# Altium footprint library 3.16-变压器.PcbLib: 17 footprints (part 1 of 2)
Each footprint in its own frame and in the unit in brackets; x right, y up, seen from the top. Pads: shape width x height; smd on the part's side, far side on the other; paste and mask are expansions set on the pad; w line width, h text height; cw(c..) or ccw(c..) is an arc to the next point about the centre after c.
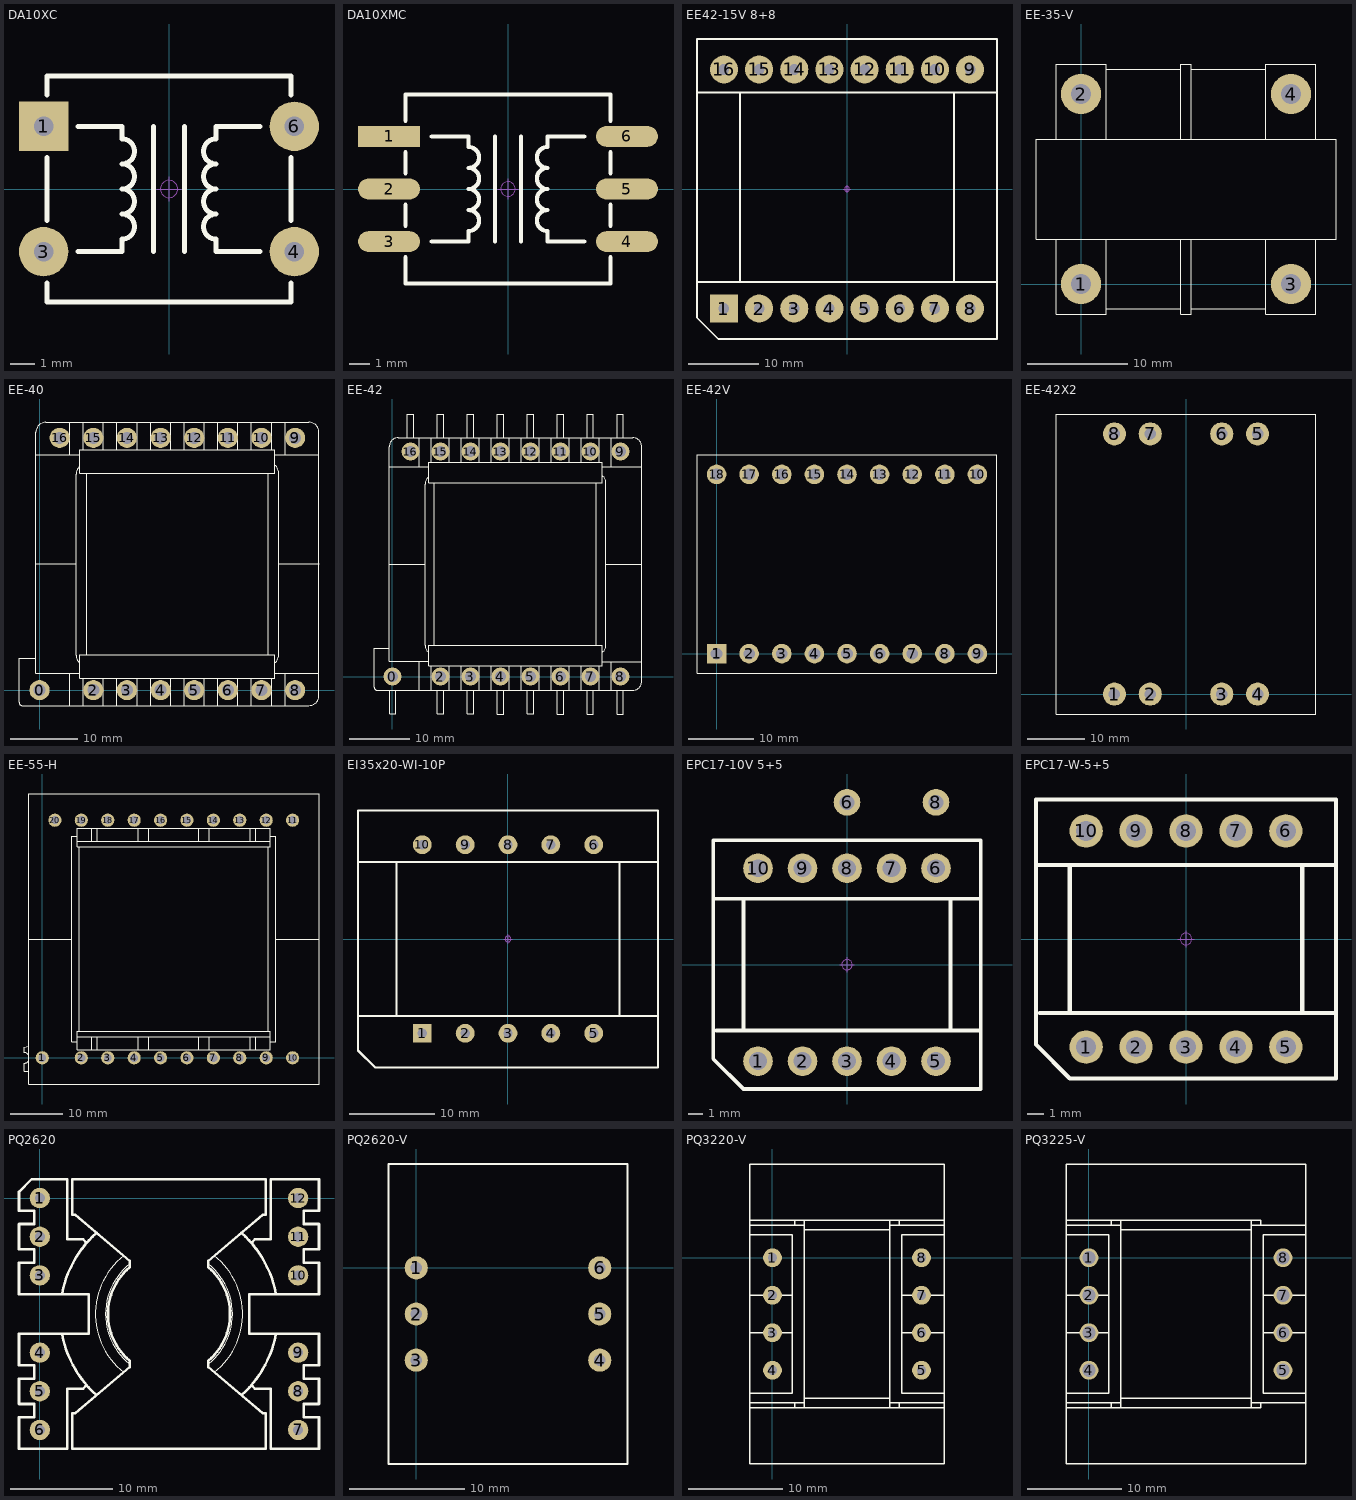
[diagram p0: the footprints below, top view; thin cyan lines are the x and y axes]

## DA10XC [mm] "9mm*9.52mm*6.35mm(长*宽*高)  淘宝ID:黄晶宝石"
pads (4):
  rect 2x2 hole 0.8 unplated: 1(-5.08,2.54)
  round 2 hole 0.8 unplated: 3(-5.08,-2.54) 4(5.08,-2.54) 6(5.08,2.54)
Top Overlay:
  lines w0.203: -4.953,-3.81 -4.953,-4.572 4.953,-4.572 4.953,-3.81 ; -4.953,-1.27 -4.953,1.27 ; -4.953,3.81 -4.953,4.572 4.953,4.572 4.953,3.81 ; -3.683,-2.54 -1.905,-2.54 -1.905,-2.032 ccw(c-1.905,-1.524) -1.905,-1.016 ccw(c-1.905,-0.508) -1.905,0 ccw(c-1.905,0.508) -1.905,1.016 ccw(c-1.905,1.524) -1.905,2.032 -1.905,2.54 -3.683,2.54 ; -0.635,-2.54 -0.635,2.54 ; 0.635,-2.54 0.635,2.54 ; 3.683,-2.54 1.905,-2.54 1.905,-2.032 cw(c1.905,-1.524) 1.905,-1.016 cw(c1.905,-0.508) 1.905,0 cw(c1.905,0.508) 1.905,1.016 cw(c1.905,1.524) 1.905,2.032 1.905,2.54 3.683,2.54 ; 4.953,-1.27 4.953,1.27
Mechanical 15:
  circle w0.05: c0,0 r0.35
  lines w0.05: -0.5,0 0.5,0 ; 0,-0.5 0,0.5
3D body "DA10XC.STEP": height 2.95, standoff -6.9, extent -5.205,-4.5 5.205,4.5

## DA10XMC [mm] "9mm*9.52mm*6.35mm(长*宽*高)  淘宝ID:黄晶宝石"
pads (6):
  rect 3x1 smd: 1(-5.75,2.54)
  oval 3x1 smd: 2(-5.75,0) 3(-5.75,-2.54) 4(5.75,-2.54) 5(5.75,0) 6(5.75,2.54)
Top Overlay:
  lines w0.203: -4.953,-3.302 -4.953,-4.572 4.953,-4.572 4.953,-3.302 ; -4.953,-1.778 -4.953,-0.762 ; -4.953,0.762 -4.953,1.778 ; -4.953,3.302 -4.953,4.572 4.953,4.572 4.953,3.302 ; -3.683,-2.54 -1.905,-2.54 -1.905,-2.032 ccw(c-1.905,-1.524) -1.905,-1.016 ccw(c-1.905,-0.508) -1.905,0 ccw(c-1.905,0.508) -1.905,1.016 ccw(c-1.905,1.524) -1.905,2.032 -1.905,2.54 -3.683,2.54 ; -0.635,-2.54 -0.635,2.54 ; 0.635,-2.54 0.635,2.54 ; 3.683,-2.54 1.905,-2.54 1.905,-2.032 cw(c1.905,-1.524) 1.905,-1.016 cw(c1.905,-0.508) 1.905,0 cw(c1.905,0.508) 1.905,1.016 cw(c1.905,1.524) 1.905,2.032 1.905,2.54 3.683,2.54 ; 4.953,-1.778 4.953,-0.762 ; 4.953,0.762 4.953,1.778
Mechanical 15:
  circle w0.05: c0,0 r0.35
  lines w0.05: -0.5,0 0.5,0 ; 0,-0.5 0,0.5
3D body "DA10xmc.STEP": height 6.4, standoff -0.08, extent -6.35,-4.5 6.35,4.5

## EE42-15V 8+8 [mm] "磁芯 42mm  宽42mm  高32mm"
pads (16):
  rect 4x4 hole 1.5: 1(-17.5,-17)
  round 4 hole 1.5: 2(-12.5,-17) 3(-7.5,-17) 4(-2.5,-17) 5(2.5,-17) 6(7.5,-17) 7(12.5,-17) 8(17.5,-17) 9(17.5,17) 10(12.5,17) 11(7.5,17) 12(2.5,17) 13(-2.5,17) 14(-7.5,17) 15(-12.5,17) 16(-17.5,17)
Top Overlay:
  lines w0.254: -21.336,-13.208 21.336,-13.208 ; -21.336,13.716 21.336,13.716 ; -15.24,-13.208 -15.24,13.716 ; 15.24,-13.208 15.24,13.716 ; -21.336,-18.288 -21.336,21.336 21.336,21.336 21.336,-21.336 -18.288,-21.336 -21.336,-18.288
Mechanical 15:
  circle w0.05: c0,0 r0.35
  lines w0.05: -0.5,0 0.5,0 ; 0,-0.5 0,0.5
3D body "EE42-15_8_8_asm.STEP": height 31.55, standoff -3.15, extent -21.1,-21.1 21.1,21.1

## EE-35-V [mm] "淘宝ID:黄晶宝石   店铺网址:https://shop463601444.taobao.com"
pads (4):
  round 4 hole 2: 1(0,0) 2(0,19) 3(21,0) 4(21,19)
Top Overlay:
  lines w0.1: 2.5,-2.453 10,-2.453 ; 2.5,4.5 2.5,-3 -2.5,-3 -2.5,4.5 ; 2.5,14.5 2.5,22 -2.5,22 ; 2.5,21.453 10,21.453 ; 10,4.5 10,-3 11,-3 11,4.5 ; 10,14.5 10,22 11,22 11,14.5 ; 11,-2.453 18.5,-2.453 ; 11,21.453 18.5,21.453 ; 18.5,4.5 18.5,-3 23.5,-3 23.5,4.5 ; 18.5,14.5 18.5,22 23.5,22 23.5,14.5 ; -2.5,4.5 -4.5,4.5 -4.5,14.5 25.5,14.5 25.5,4.5 23.5,4.5 ; -2.5,4.5 23.5,4.5 ; -2.5,22 -2.5,14.5 -2.5,22 ; 0,19.25 0,19.25
3D body "EE35-4.STEP": height 35.61, standoff -5.5, extent -4.57,-2.921 24.89,21.579

## EE-40 [mm] "淘宝ID:黄晶宝石   店铺网址:https://shop463601444.taobao.com"
pads (16):
  round 3 hole 1.8: 0(0,0) 2(8,0) 3(13,0) 4(18,0) 5(23,0) 6(28,0) 7(33,0) 8(38,0) 9(38,37.5) 10(33,37.5) 11(28,37.5) 12(23,37.5) 13(18,37.5) 14(13,37.5) 15(8,37.5) 16(3,37.5)
Top Overlay:
  lines w0.1: -2.55,-2.303 40.05,-2.303 ; -2.55,-2.3 cw(c-2.55,-1.8) -3.05,-1.8 -3.05,4.7 -0.556,4.7 ; -0.55,2.509 -0.55,38.3 cw(c0.95,38.3) 0.95,39.8 40.05,39.8 cw(c40.05,38.3) 41.55,38.3 41.55,-0.8 cw(c40.05,-0.8) 40.05,-2.3 ; -0.55,18.75 5.449,18.75 ; -0.544,2.509 6,2.509 ; -0.544,34.991 6,34.991 ; 4.5,-2.303 4.5,2.509 ; 4.5,34.991 4.5,39.8 ; 5.995,4.043 cw(c6.949,5.2) 5.449,5.2 5.449,32.079 cw(c6.949,32.079) 5.995,33.236 ; 6.5,-2.303 6.5,1.75 ; 6.5,35.75 6.5,39.8 ; 7,5.25 7,32.25 ; 9.5,-2.303 9.5,1.75 ; 9.5,35.75 9.5,39.8 ; 11.5,-2.303 11.5,1.75 ; 11.5,35.75 11.5,39.8 ; 14.5,-2.303 14.5,1.75 ; 14.5,35.75 14.5,39.8 ; 16.5,-2.303 16.5,1.75 ; 16.5,35.75 16.5,39.8 ; 19.5,-2.303 19.5,1.75 ; 19.5,35.75 19.5,39.8 ; 21.5,-2.303 21.5,1.75 ; 21.5,35.75 21.5,39.8 ; 24.5,-2.303 24.5,1.75 ; 24.5,35.75 24.5,39.8 ; 26.5,-2.303 26.5,1.75 ; 26.5,35.75 26.5,39.8 ; 29.5,-2.303 29.5,1.75 ; 29.5,35.75 29.5,39.8 ; 31.5,-2.303 31.5,1.75 ; 31.5,35.75 31.5,39.8 ; 34,5.25 34,32.25 ; 34.5,-2.303 34.5,1.75 ; 34.5,35.75 34.5,39.8 ; 35,2.5 41.55,2.5 ; 35,35 41.55,35 ; 35.005,4.042 ccw(c34.051,5.199) 35.551,5.199 35.551,32.3 ccw(c34.051,32.3) 35.005,33.457 ; 35.551,18.75 41.55,18.75 ; 36.5,-2.303 36.5,2.5 ; 36.5,35 36.5,39.8 ; 6,1.75 35,1.75 ; 6,1.75 35,1.75 ; 6,1.75 6,5.25 35,5.25 35,1.75 ; 6,32.25 35,32.25 35,35.75 6,35.75 6,32.25
3D body "User Library-power_transformer.step": height 32.94, standoff -3.5, extent 0.254,-3.478 40.259,40.562

## EE-42 [mm] "淘宝ID:黄晶宝石   店铺网址:https://shop463601444.taobao.com"
pads (16):
  round 3 hole 1.8: 0(0,0) 2(8,0) 3(13,0) 4(18,0) 5(23,0) 6(28,0) 7(33,0) 8(38,0) 9(38,37.5) 10(33,37.5) 11(28,37.5) 12(23,37.5) 13(18,37.5) 14(13,37.5) 15(8,37.5) 16(3,37.5)
Top Overlay:
  lines w0.1: -2.55,-2.303 40.05,-2.303 ; -2.55,-2.3 cw(c-2.55,-1.8) -3.05,-1.8 -3.05,4.7 -0.556,4.7 ; -0.55,2.509 -0.55,38.3 cw(c0.95,38.3) 0.95,39.8 40.05,39.8 cw(c40.05,38.3) 41.55,38.3 41.55,-0.8 cw(c40.05,-0.8) 40.05,-2.3 ; -0.55,18.75 5.449,18.75 ; -0.544,2.509 6,2.509 ; -0.544,34.991 6,34.991 ; -0.5,-2.303 -0.5,-6.248 0.5,-6.248 0.5,-2.303 ; 2.5,39.809 2.5,43.75 3.5,43.75 3.5,39.814 ; 4.5,-2.303 4.5,2.509 ; 4.5,34.991 4.5,39.8 ; 5.995,4.043 cw(c6.949,5.2) 5.449,5.2 5.449,32.079 cw(c6.949,32.079) 5.995,33.236 ; 6.5,-2.303 6.5,1.75 ; 6.5,35.75 6.5,39.8 ; 7,5.25 7,32.25 ; 7.5,-2.3 7.5,-6.248 8.493,-6.248 8.5,-6.241 8.5,-2.3 ; 7.5,39.8 7.5,43.748 8.493,43.748 8.5,43.741 8.5,39.8 ; 9.5,-2.303 9.5,1.75 ; 9.5,35.75 9.5,39.8 ; 11.5,-2.303 11.5,1.75 ; 11.5,35.75 11.5,39.8 ; 12.5,-2.3 12.5,-6.247 13.5,-6.247 13.5,-2.3 ; 12.5,39.8 12.5,43.747 13.5,43.747 13.5,39.8 ; 14.5,-2.303 14.5,1.75 ; 14.5,35.75 14.5,39.8 ; 16.5,-2.303 16.5,1.75 ; 16.5,35.75 16.5,39.8 ; 17.5,-2.3 17.5,-6.25 18.5,-6.25 18.5,-2.311 ; 17.5,39.8 17.5,43.75 18.5,43.75 18.5,39.811 ; 19.5,-2.303 19.5,1.75 ; 19.5,35.75 19.5,39.8 ; 21.5,-2.303 21.5,1.75 ; 21.5,35.75 21.5,39.8 ; 22.5,-2.3 22.5,-6.238 23.495,-6.238 23.5,-6.233 23.5,-2.3 ; 22.5,39.8 22.5,43.738 23.495,43.738 23.5,43.733 23.5,39.8 ; 24.5,-2.303 24.5,1.75 ; 24.5,35.75 24.5,39.8 ; 26.5,-2.303 26.5,1.75 ; 26.5,35.75 26.5,39.8 ; 27.5,-2.311 27.5,-6.25 28.5,-6.25 28.5,-2.313 ; 27.5,39.811 27.5,43.75 28.5,43.75 28.5,39.813 ; 29.5,-2.303 29.5,1.75 ; 29.5,35.75 29.5,39.8 ; 31.5,-2.303 31.5,1.75 ; 31.5,35.75 31.5,39.8 ; 32.5,-2.309 32.5,-6.25 33.488,-6.25 33.488,-2.313 ; 32.5,39.809 32.5,43.75 33.488,43.75 33.488,39.813 ; 34,5.25 34,32.25 ; 34.5,-2.303 34.5,1.75 ; 34.5,35.75 34.5,39.8 ; 35,2.5 41.55,2.5 ; 35,35 41.55,35 ; 35.005,4.042 ccw(c34.051,5.199) 35.551,5.199 35.551,32.3 ccw(c34.051,32.3) 35.005,33.457 ; 35.551,18.75 41.55,18.75 ; 36.5,-2.303 36.5,2.5 ; 36.5,35 36.5,39.8 ; 37.5,-2.324 37.5,-6.25 38.5,-6.25 38.5,-2.317 ; 37.5,39.824 37.5,43.75 38.5,43.75 38.5,39.817 ; 6,1.75 35,1.75 ; 6,1.75 35,1.75 ; 6,1.75 6,5.25 35,5.25 35,1.75 ; 6,32.25 35,32.25 35,35.75 6,35.75 6,32.25
3D body "Coilcraft-GA3366-BL.step": height 29.2, standoff -5, extent -0.229,-3 40.271,40.5

## EE-42V [mm] "淘宝ID:黄晶宝石   店铺网址:https://shop463601444.taobao.com"
pads (18):
  rect 3x3 hole 1.8: 1(0,0)
  round 3 hole 1.8: 2(5,0) 3(10,0) 4(15,0) 5(20,0) 6(25,0) 7(30,0) 8(35,0) 9(40,0) 10(40,27.5) 11(35,27.5) 12(30,27.5) 13(25,27.5) 14(20,27.5) 15(15,27.5) 16(10,27.5) 17(5,27.5) 18(0,27.5)
Top Overlay:
  lines w0.1: -3,-3 -3,30.5 43,30.5 43,-3 -3,-3
3D body "EE42.STEP": height 48.8, standoff -4.15, extent -2.667,-2.855 42.833,29.845

## EE-42X2 [mm] "淘宝ID:黄晶宝石   店铺网址:https://shop463601444.taobao.com"
pads (8):
  round 4 hole 2: 1(-12.4,0) 2(-6.2,0) 3(6.2,0) 4(12.4,0) 5(12.4,45.1) 6(6.2,45.1) 7(-6.2,45.1) 8(-12.4,45.1)
Top Overlay:
  lines w0.1: -22.5,-3.45 22.5,-3.45 22.5,48.55 -22.5,48.55 -22.5,-3.45
3D body "EE42x2.STEP": height 44.16, standoff -3.2, extent -21.227,-1.905 20.973,47.095

## EE-55-H [mm]
pads (20):
  round 2.5 hole 1.5: 1(0,0) 2(7.4,0) 3(12.4,0) 4(17.4,0) 5(22.4,0) 6(27.4,0) 7(32.4,0) 8(37.4,0) 9(42.4,0) 10(47.4,0) 11(47.4,45) 12(42.4,45) 13(37.4,45) 14(32.4,45) 15(27.4,45) 16(22.4,45) 17(17.4,45) 18(12.4,45) 19(7.4,45) 20(2.4,45)
Top Overlay:
  lines w0.1: -3.4,-1 ccw(c-3.4,0) -2.605,-0.607 ; -3.4,1 cw(c-3.4,0) -2.605,0.607
  lines w0.2: -3.4,-1 -3.4,-2.5 -2.613,-2.5 ; -3.4,1 -3.4,2 -2.603,2.214 ; -2.566,22.5 5.585,22.5 ; 6.589,3 5.6,3 5.6,42 6.589,42 ; 6.6,1.5 43.2,1.5 ; 6.6,40.002 6.6,43.5 43.2,43.5 ; 6.602,1.502 6.602,5 43.198,5 43.198,1.502 ; 6.602,4 43.198,4 ; 6.602,40 43.198,40 43.198,43.498 ; 6.602,41 43.198,41 ; 7,5 7,40 ; 9.4,1.507 9.4,4.002 ; 9.4,40.998 9.4,43.493 ; 10.4,1.507 10.4,4.002 ; 10.4,40.998 10.4,43.493 ; 18.15,1.514 18.15,3.993 ; 18.15,41.007 18.15,43.486 ; 20.15,1.514 20.15,3.993 ; 20.15,41.007 20.15,43.486 ; 29.65,1.514 29.65,3.993 ; 29.65,41.007 29.65,43.486 ; 31.65,1.514 31.65,3.993 ; 31.65,41.007 31.65,43.486 ; 39.4,1.507 39.4,3.993 ; 39.4,41.007 39.4,43.493 ; 40.4,1.507 40.4,3.993 ; 40.4,41.007 40.4,43.493 ; 42.8,4.992 42.8,39.992 ; 43.211,3 44.2,3 44.2,42 43.211,42 ; 44.215,22.5 52.366,22.5 ; -2.6,-5 -2.6,50 52.4,50 52.4,-5 -2.6,-5
3D body "EE55-h.STEP": height 50.03, standoff -4.2, extent -3.302,-5.086 52.528,50.044

## EI35x20-WI-10P [mm] "长：35mm，宽：30mm，高：33mm  淘宝ID:黄晶宝石"
pads (10):
  rect 2.2x2.2 hole 1.1: 1(-10,-11)
  round 2.2 hole 1.1: 2(-5,-11) 3(0,-11) 4(5,-11) 5(10,-11) 6(10,11) 7(5,11) 8(0,11) 9(-5,11) 10(-10,11)
Top Overlay:
  lines w0.254: -17.5,-9 17.5,-9 ; -17.5,9 17.5,9 ; -13,-9 -13,9 ; 13,-9 13,9 ; -17.5,-13 -15.5,-15 17.5,-15 17.5,15 -17.5,15 -17.5,-13
Mechanical 15:
  circle w0.05: c0,0 r0.35
  lines w0.05: -0.5,0 0.5,0 ; 0,-0.5 0,0.5
3D body "ei35x20-wi-10p_asm.STEP": height 33.55, standoff -2.95, extent -17.5,-15 17.5,15

## EPC17-10V 5+5 [mm] "磁芯17mm，高10mm，脚距3mm，  淘宝ID:黄晶宝石"
pads (12):
  round 2 hole 1.2: 1(-6,-6.5) 2(-3,-6.5) 3(0,-6.5) 4(3,-6.5) 5(6,-6.5) 6(6,6.5) 7(3,6.5) 8(0,6.5) 9(-3,6.5) 10(-6,6.5)
  round 1.8 hole 1: 6(0,10.945) 8(6,10.945)
Top Overlay:
  lines w0.254: -9.017,4.445 9.017,4.445 ; -8.794,-4.445 9.017,-4.445 ; -6.985,-4.445 -6.985,4.445 ; 6.985,-4.445 6.985,4.445 ; -9.017,-6.35 -6.985,-8.382 9.017,-8.382 9.017,8.382 -9.017,8.382 -9.017,-6.35
Mechanical 15:
  circle w0.05: c0,0 r0.35
  lines w0.05: -0.5,0 0.5,0 ; 0,-0.5 0,0.5
3D body "EPC17-10_5_5.STEP": height 9.75, standoff -3.15, extent -8.75,-8.1 8.75,8.1

## EPC17-W-5+5 [mm] "磁芯17mm，高10mm，脚距3mm， 淘宝ID:黄晶宝石"
pads (10):
  round 2 hole 1.2: 1(-6,-6.5) 2(-3,-6.5) 3(0,-6.5) 4(3,-6.5) 5(6,-6.5) 6(6,6.5) 7(3,6.5) 8(0,6.5) 9(-3,6.5) 10(-6,6.5)
Top Overlay:
  lines w0.254: -9.017,4.445 9.017,4.445 ; -8.794,-4.445 9.017,-4.445 ; -6.985,-4.445 -6.985,4.445 ; 6.985,-4.445 6.985,4.445 ; -9.017,-6.35 -9.017,8.382 9.017,8.382 9.017,-8.382 -6.985,-8.382 -9.017,-6.35
Mechanical 15:
  circle w0.05: c0,0 r0.35
  lines w0.05: -0.5,0 0.5,0 ; 0,-0.5 0,0.5
3D body "EPC17-10_5_5.STEP": height 9.75, standoff -3.15, extent -8.75,-8.1 8.75,8.1

## PQ2620 [mm]
height 20.5
pads (12):
  round 2 hole 1: 1(0,0) 2(0,-3.8) 3(0,-7.6) 4(0,-15.2) 5(0,-19) 6(0,-22.8) 7(25.4,-22.8) 8(25.4,-19) 9(25.4,-15.2) 10(25.4,-7.6) 11(25.4,-3.8) 12(25.4,0)
Top Overlay:
  lines w0.1: 8.241,-17.117 cw(c12.7,-11.4) 8.249,-5.677 ; 8.838,-16.314 cw(c12.7,-11.4) 8.845,-6.48 ; 16.555,-6.48 cw(c12.7,-11.4) 16.562,-16.314 ; 17.151,-5.677 cw(c12.7,-11.4) 17.159,-17.117
  lines w0.254: 2.192,-13.418 ccw(c12.7,-11.4) 5.563,-19.372 ; 2.192,-9.382 cw(c12.7,-11.4) 5.578,-3.414 ; 4.609,-18.403 4.262,-18.75 2.7,-18.75 2.7,-24.65 -2.05,-24.65 -2.05,-21.55 -0.55,-21.55 -0.55,-20.25 -2.05,-20.25 -2.05,-17.75 -0.55,-17.75 -0.55,-16.45 -2.05,-16.45 -2.05,-13.35 4.8,-13.35 4.8,-9.45 -2.05,-9.45 -2.05,-6.35 -0.55,-6.35 -0.55,-5.05 -2.05,-5.05 -2.05,-2.55 -0.55,-2.55 -0.55,-1.25 -2.05,-1.25 -2.05,0.602 -0.802,1.85 2.7,1.85 2.7,-4.05 4.262,-4.05 4.609,-4.397 ; 8.843,-15.997 8.843,-16.617 3.5,-21.15 3.2,-21.15 3.2,-24.65 22.2,-24.65 22.2,-21.15 21.9,-21.15 16.556,-16.617 16.556,-15.997 ; 8.843,-15.996 cw(c12.7,-11.4) 8.843,-6.804 8.843,-6.183 ; 8.844,-6.183 3.5,-1.65 3.2,-1.65 3.2,1.85 22.2,1.85 22.2,-1.65 21.9,-1.65 16.557,-6.182 16.557,-6.803 cw(c12.7,-11.4) 16.557,-15.996 ; 19.822,-3.414 cw(c12.7,-11.4) 23.208,-9.382 ; 19.837,-19.372 ccw(c12.7,-11.4) 23.208,-13.418 ; 20.791,-18.403 21.138,-18.75 22.7,-18.75 22.7,-24.65 27.45,-24.65 27.45,-21.55 25.95,-21.55 25.95,-20.25 27.45,-20.25 27.45,-17.75 25.95,-17.75 25.95,-16.45 27.45,-16.45 27.45,-13.35 20.6,-13.35 20.6,-9.45 27.45,-9.45 27.45,-6.35 25.95,-6.35 25.95,-5.05 27.45,-5.05 27.45,-2.55 25.95,-2.55 25.95,-1.25 27.45,-1.25 27.45,1.85 22.7,1.85 22.7,-4.05 21.138,-4.05 20.791,-4.397
3D body "PQ-26.STEP": height 25.1, standoff -4.4, extent -1.41,-24.507 27.19,1.693

## PQ2620-V [mm]
height 20.5
pads (6):
  round 2 hole 1: 1(0,0) 2(0,-4) 3(0,-8) 4(15.9,-8) 5(15.9,-4) 6(15.9,0)
Top Overlay:
  lines w0.15: -2.4,-17 18.3,-17 18.3,9 -2.4,9 -2.4,-17
3D body "260_1_.STEP": height 26.9, standoff -4, extent -2.504,-16.937 18.296,9.063

## PQ3220-V [mm]
height 20.5
pads (8):
  round 2 hole 1: 1(0,0) 2(0,-4) 3(0,-8) 4(0,-12) 5(15.9,-12) 6(15.9,-8) 7(15.9,-4) 8(15.9,0)
Top Overlay:
  lines w0.15: -2.4,-16 18.3,-16 ; -2.4,-14.45 2.1,-14.45 2.1,2.45 -2.4,2.45 ; -2.4,-8 2.102,-8 ; -2.4,-4 2.1,-4 ; -2.4,4 18.3,4 ; -2.397,-15.45 3.4,-15.45 ; -2.397,3.45 3.4,3.45 ; 2.4,-16 2.4,-15.45 ; 2.4,3.45 2.4,4 ; 3.4,-16 3.4,-15.45 ; 3.4,-15 12.5,-15 ; 3.4,3 12.5,3 ; 3.4,4 3.4,3.45 ; 12.5,-16 12.5,-15.45 ; 12.5,4 12.5,3.45 ; 13.5,-16 13.5,-15.45 ; 13.5,3.45 13.5,4 ; 13.798,-8 18.3,-8 ; 13.8,-4 18.3,-4 ; 18.297,-15.45 12.5,-15.45 ; 18.297,3.45 12.5,3.45 ; 18.3,-14.45 13.8,-14.45 13.8,2.45 18.3,2.45 ; 3.4,-15.45 3.4,3.45 ; 12.5,-15.45 12.5,3.45 ; -2.4,-22 18.3,-22 18.3,10 -2.4,10 -2.4,-22
3D body "pq-32-2-2.STEP": height 29.88, standoff -3.82, extent -2.079,-21.82 17.921,9.88

## PQ3225-V [mm] "淘宝ID:黄晶宝石   店铺网址:https://shop463601444.taobao.com"
height 20.5
pads (8):
  round 2 hole 1.4: 1(0,0) 2(0,-4) 3(0,-8) 4(0,-12) 5(20.7,-12) 6(20.7,-8) 7(20.7,-4) 8(20.7,0)
Top Overlay:
  lines w0.15: -2.4,-16 18.3,-16 18.3,-15.45 ; -2.4,-14.45 2.1,-14.45 2.1,2.45 -2.4,2.45 ; -2.4,-8 2.102,-8 ; -2.4,-4 2.1,-4 ; -2.4,4 18.3,4 18.3,3.45 ; -2.397,-15.45 3.4,-15.45 ; -2.397,3.45 3.4,3.45 ; 2.4,-16 2.4,-15.45 ; 2.4,3.45 2.4,4 ; 3.4,-16 3.4,-15.45 ; 3.4,-15 17.295,-15 ; 3.4,3 17.298,3 ; 3.4,4 3.4,3.45 ; 17.3,-16 17.3,-15.45 ; 17.3,4 17.3,3.45 ; 18.598,-8 23.1,-8 ; 18.6,-4 23.1,-4 ; 23.097,-15.45 17.3,-15.45 ; 23.097,3.45 17.3,3.45 ; 23.1,-14.45 18.6,-14.45 18.6,2.45 23.1,2.45 ; 3.4,-15.45 3.4,3.45 ; 17.3,-15.45 17.3,3.45 ; -2.4,-22 23.1,-22 23.1,10 -2.4,10 -2.4,-22
3D body "PQ-32-2.STEP": height 29.8, standoff -3.82, extent -2.15,-21.85 22.85,9.85